# Altium footprint library fszhang.PcbLib: 1032 footprints (part 66 of 66)
Each footprint in its own frame and in the unit in brackets; x right, y up, seen from the top. Pads: shape width x height; smd on the part's side, far side on the other; paste and mask are expansions set on the pad; w line width, h text height; cw(c..) or ccw(c..) is an arc to the next point about the centre after c.
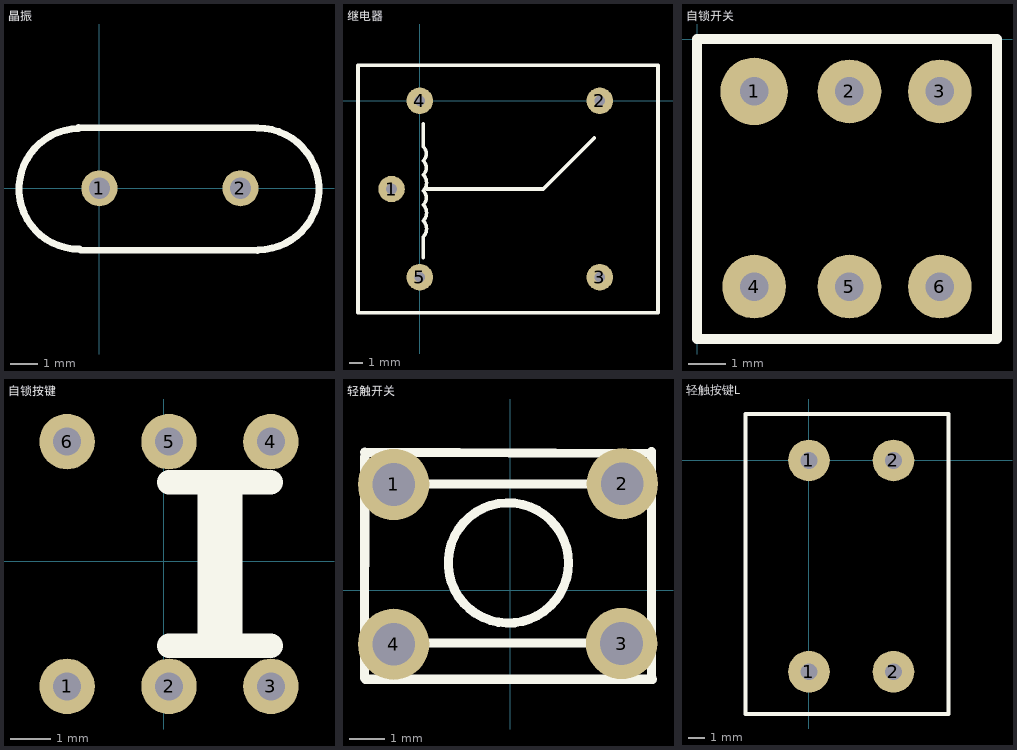
[diagram p65: the footprints below, top view; thin cyan lines are the x and y axes]

## 晶振 [mm]
pads (2):
  round 1.3 hole 0.762: 1(0,0) 2(5.08,0)
Top Overlay:
  lines w0.254: -0.757,2.185 5.677,2.165 ; -0.755,2.153 ccw(c-0.723,-0.021) -0.723,-2.195 ; -0.683,-2.215 5.697,-2.235 ; 5.717,-2.215 ccw(c5.717,-0.023) 5.717,2.17

## 继电器 [mil]
pads (5):
  round 75 hole 30: 1(-80,-250) 2(510,0) 3(510,-500) 4(0,0) 5(0,-500)
Top Overlay:
  lines w10: 10,-445 10,-385 ccw(c-12.5,-362.5) 10,-340 ccw(c-12.5,-317.5) 10,-295 ccw(c-10,-275) 10,-255 ccw(c-12.5,-232.5) 10,-210 ccw(c-10,-190) 10,-170 ccw(c-10,-150) 10,-130 10,-65 ; 20,-250 350,-250 495,-105 ; -175,-600 675,-600 675,100 -175,100 -175,-250 -175,-600

## 自锁开关 [mil]
pads (6):
  round 70.87 hole 30: 1(60,-55)
  round 66.93 hole 30: 2(160,-55) 3(255,-55) 4(60,-260) 5(160,-260) 6(255,-260)
Top Overlay:
  lines w10: 0,-315 315,-315 315,0 0,0 0,-315

## 自锁按键 [mm]
pads (6):
  round 1.38 hole 0.7: 1(-2.409,-3.119) 2(0.131,-3.119) 3(2.671,-3.119) 4(2.671,2.977) 5(0.131,2.977) 6(-2.409,2.977)
Top Overlay:
  lines w0.61: 0.131,-2.103 2.671,-2.103 ; 0.131,1.961 2.671,1.961 ; 1.147,-2.103 1.147,1.707 ; 1.655,-2.103 1.655,1.961

## 轻触开关 [mm]
pads (4):
  round 2 hole 1.2: 1(-3.27,2.96) 2(3.14,2.98) 3(3.12,-1.5) 4(-3.27,-1.52)
Top Overlay:
  circle w0.254: c-0.056,0.76 r1.686
  lines w0.254: -4.09,-2.46 -4.08,3.735 ; -4.08,3.862 3.96,3.83 ; -4.062,-2.5 3.98,-2.5 ; -3.191,2.973 3.413,2.973 ; -3.107,-1.48 3.37,-1.48 ; 3.958,-2.502 3.96,3.88

## 轻触按键L [mm]
pads (4):
  round 2.5 hole 1: 1(0,-12.7) 1(0,0) 2(5.08,-12.7) 2(5.08,0)
Top Overlay:
  lines w0.254: -3.81,-15.24 -3.81,2.794 8.382,2.794 8.382,-15.24 -3.81,-15.24